# Altium footprint library custom-case.PcbLib: 380 footprints (part 9 of 24)
Each footprint in its own frame and in the unit in brackets; x right, y up, seen from the top. Pads: shape width x height; smd on the part's side, far side on the other; paste and mask are expansions set on the pad; w line width, h text height; cw(c..) or ccw(c..) is an arc to the next point about the centre after c.
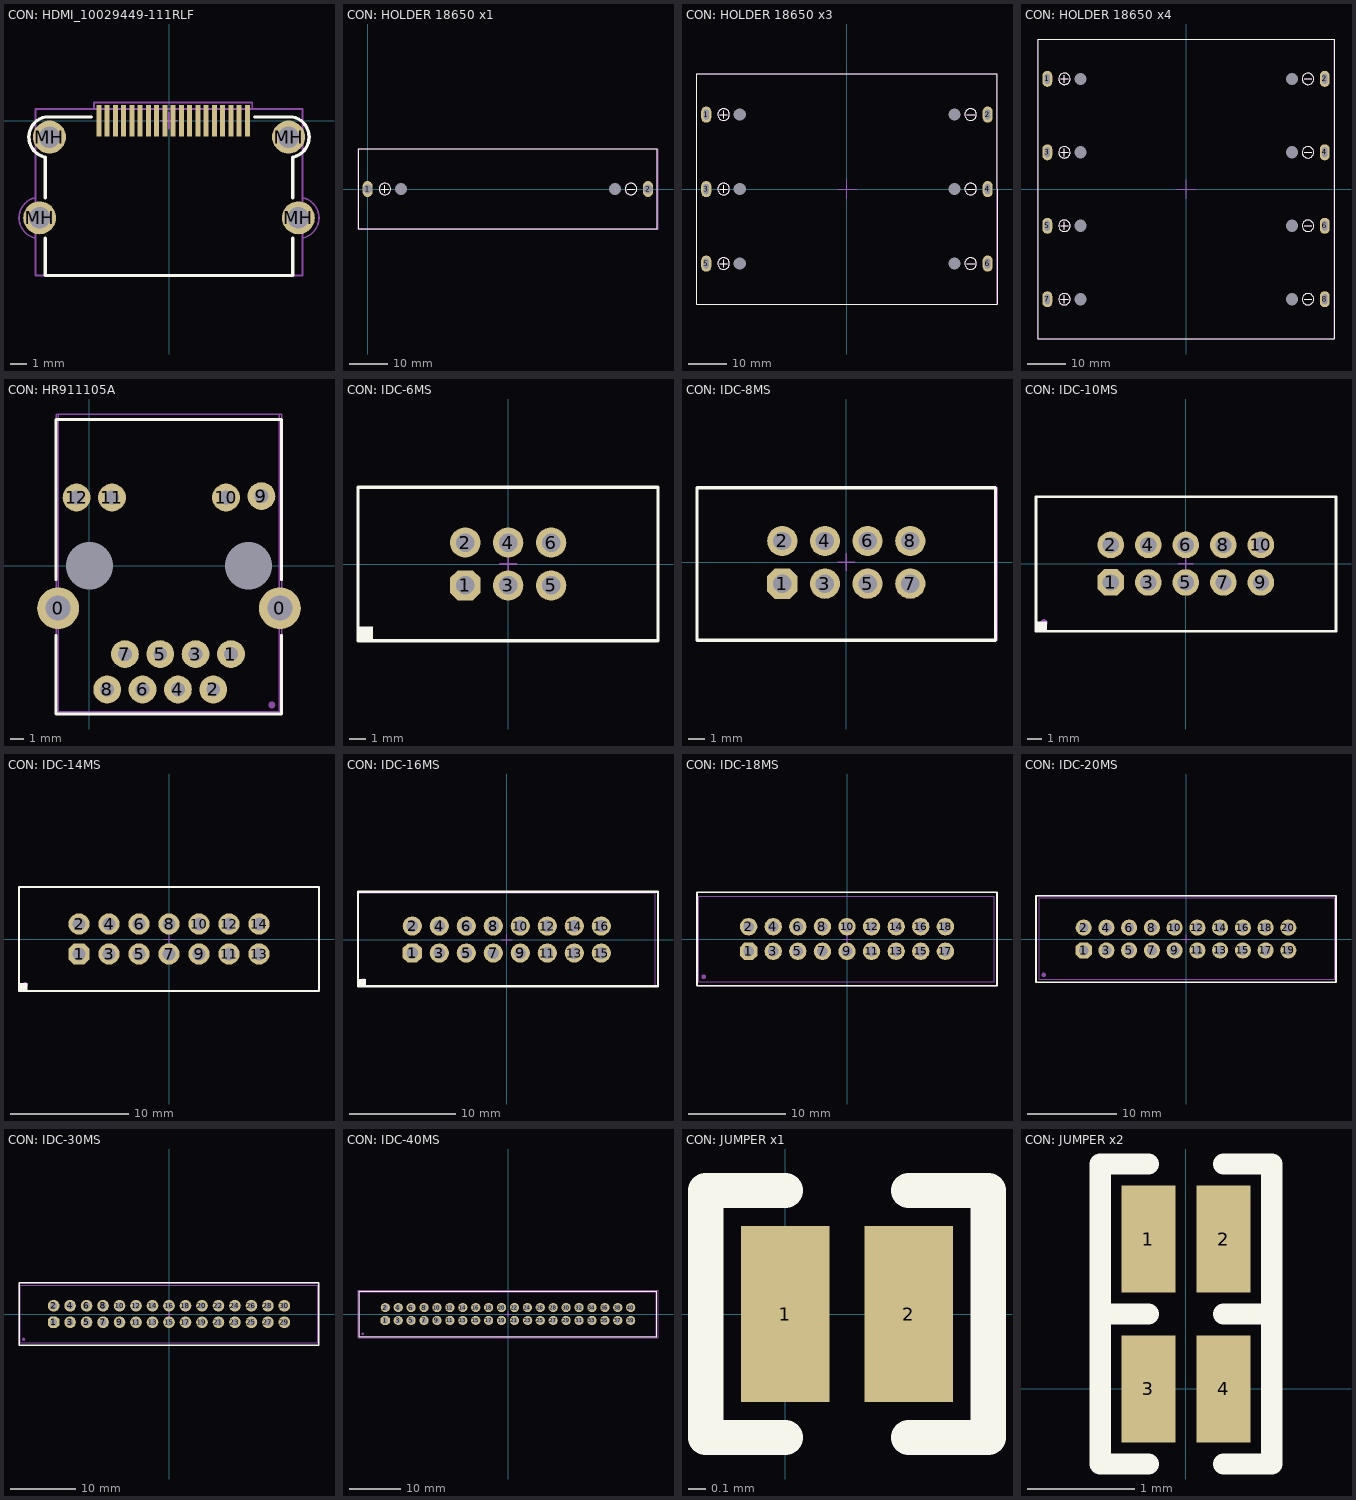
[diagram p8: the footprints below, top view; thin cyan lines are the x and y axes]

## CON: HDMI_10029449-111RLF [mm] "HDMI 1.4, Amphenol"
pads (23):
  rect 0.3x1.9 smd mask+0.102: 1(4.75,0) 2(4.25,0) 3(3.75,0) 4(3.25,0) 5(2.75,0) 6(2.25,0) 7(1.75,0) 8(1.25,0) 9(0.75,0) 10(0.25,0) 11(-0.25,0) 12(-0.75,0) 13(-1.25,0) 14(-1.75,0) 15(-2.25,0) 16(-2.75,0) 17(-3.25,0) 18(-3.75,0) 19(-4.25,0)
  round 2 hole 1.3 mask+0.102: MH(-7.85,-5.9) MH(-7.25,-1) MH(7.25,-1) MH(7.85,-5.9)
Top Overlay:
  lines w0.2: -7.505,-2.224 cw(c-7.25,-1) -7.505,0.224 -4.7,0.224 ; -7.5,-7.125 -7.5,-9.4 7.5,-9.4 7.5,-7.125 ; -7.5,-4.675 -7.5,-2.224 ; 5.2,0.224 7.505,0.224 cw(c7.25,-1) 7.505,-2.224 ; 7.5,-4.675 7.5,-2.224
Top Assy:
  lines w0.1: -8.1,-9.4 -8.1,0.7 8.1,0.7 8.1,-9.4 -8.1,-9.4
Size Area:
  lines w0.1: -8.1,-7.125 cw(c-7.85,-5.9) -8.1,-4.675 -8.1,-1.925 ; -8.1,-7.122 -8.1,-9.4 8.1,-9.4 8.1,-7.122 ; -8.1,-0.083 -8.1,0.7 -4.55,0.7 -4.55,1.1 5.05,1.1 5.05,0.7 8.1,0.7 8.1,-0.083 ; -8.097,-1.919 cw(c-7.25,-1) -8.097,-0.081 ; -0.5,0 0.5,0 ; 0,-0.5 0,0.5 ; 8.097,-1.919 ccw(c7.25,-1) 8.097,-0.081 ; 8.1,-7.125 ccw(c7.85,-5.9) 8.1,-4.675 8.1,-1.925
3D body "10029449-111RLF v1.step": height 6.28, standoff -1.86, extent -8.1,-9.4 8.1,0.7

## CON: HOLDER 18650 x1 [mm]
pads (4):
  oval 2.6x4.2 hole 2.4 square: 1(0,0) 2(72.9,0)
  round 0 hole 3.2: 2(8.7,0) 2(64.3,0)
Top Overlay:
  circle w0.2: c68.5,0 r1.5
  circle w0.2: c4.5,0 r1.5
  lines w0.2: 3.5,0 5.5,0 ; 4.5,-1 4.5,1 ; 67.5,0 69.5,0 ; -2.325,-10.4 75.325,-10.4 75.325,10.4 -2.325,10.4 -2.325,-10.4
Top Assy:
  lines w0.1: -2.325,-10.4 -2.325,10.4 75.325,10.4 75.325,-10.4 -2.325,-10.4
3D model:
  circle w0.1: c4.5,0 r1.5
  circle w0.1: c68.5,0 r1.5
  lines w0.1: 3.5,0 5.5,0 ; 4.5,-1 4.5,1 ; 67.5,0 69.5,0
Size Area:
  lines w0.1: -2.5,-10.5 75.5,-10.5 75.5,10.5 -2.5,10.5 -2.5,-10.5
3D body "User Library-18650 battery.STEP": height 21.87, standoff 3.67, extent 3.875,-9.05 69.025,9.15
3D body "User Library-18650 Full.STEP": height 21.65, standoff -3.83, extent -2.325,-10.4 75.325,10.4

## CON: HOLDER 18650 x3 [mm] "BK-18650-PC6, MPD"
pads (12):
  oval 2.6x4.2 hole 1.4 slot 2.6 at 90 deg: 1(-36.45,19.3) 2(36.45,19.3) 3(-36.45,0) 4(36.45,0) 5(-36.45,-19.3) 6(36.45,-19.3)
  round 0 hole 3.2: 2(-27.75,-19.3) 2(-27.75,0) 2(-27.75,19.3) 2(27.85,-19.3) 2(27.85,0) 2(27.85,19.3)
Top Overlay:
  circle w0.2: c-31.95,19.3 r1.5
  circle w0.2: c32.05,19.3 r1.5
  circle w0.2: c-31.95,-19.3 r1.5
  circle w0.2: c32.05,-19.3 r1.5
  circle w0.2: c-31.95,0 r1.5
  circle w0.2: c32.05,0 r1.5
  lines w0.2: -32.95,-19.3 -30.95,-19.3 ; -32.95,0 -30.95,0 ; -32.95,19.3 -30.95,19.3 ; -31.95,-20.3 -31.95,-18.3 ; -31.95,-1 -31.95,1 ; -31.95,18.3 -31.95,20.3 ; 31.05,-19.3 33.05,-19.3 ; 31.05,0 33.05,0 ; 31.05,19.3 33.05,19.3 ; -38.85,-29.85 38.875,-29.85 38.85,29.875 -38.85,29.85 -38.85,-29.85
Top Assy:
  circle w0.1: c32.05,-19.3 r1.5
  circle w0.1: c32.05,0 r1.5
  circle w0.1: c32.05,19.3 r1.5
  circle w0.1: c-31.95,19.3 r1.5
  circle w0.1: c-31.95,-19.3 r1.5
  circle w0.1: c-31.95,0 r1.5
  lines w0.1: -32.95,-19.3 -30.95,-19.3 ; -32.95,0 -30.95,0 ; -32.95,19.3 -30.95,19.3 ; -31.95,-20.3 -31.95,-18.3 ; -31.95,-1 -31.95,1 ; -31.95,18.3 -31.95,20.3 ; 31.05,-19.3 33.05,-19.3 ; 31.05,0 33.05,0 ; 31.05,19.3 33.05,19.3 ; -38.85,-29.85 38.85,-29.85 38.85,29.85 -38.85,29.85 -38.85,-29.85
Size Area:
  lines w0.1: -2.5,0 2.5,0 ; 0,-2.5 0,2.5 ; -38.85,-29.85 38.85,-29.85 38.85,29.85 -38.85,29.85 -38.85,-29.85
3D body "User Library-18650 battery.STEP": height 21.87, standoff 3.67, extent -32.575,10.25 32.575,28.45
3D body "User Library-18650 battery.STEP": height 21.87, standoff 3.67, extent -32.575,-9.05 32.575,9.15
3D body "User Library-18650 battery.STEP": height 21.87, standoff 3.67, extent -32.575,-28.35 32.575,-10.15
3D body "BK-18650-PC6.STEP": height 21.74, standoff -3, extent -38.85,-29.845 38.85,29.845

## CON: HOLDER 18650 x4 [mm] "BK-18650-PC8, MPD"
pads (16):
  oval 2.6x4.2 hole 1.4 slot 2.6 at 90 deg: 1(-36.45,28.95) 2(36.45,28.95) 3(-36.45,9.65) 4(36.45,9.65) 5(-36.45,-9.65) 6(36.45,-9.65) 7(-36.45,-28.95) 8(36.45,-28.95)
  round 0 hole 3.2: 2(-27.75,-28.95) 2(-27.75,-9.65) 2(-27.75,9.65) 2(-27.75,28.95) 2(27.85,-28.95) 2(27.85,-9.65) 2(27.85,9.65) 2(27.85,28.95)
Top Overlay:
  circle w0.2: c-31.95,28.95 r1.5
  circle w0.2: c32.05,28.95 r1.5
  circle w0.2: c-31.95,-9.65 r1.5
  circle w0.2: c32.05,-9.65 r1.5
  circle w0.2: c-31.95,9.65 r1.5
  circle w0.2: c32.05,9.65 r1.5
  circle w0.2: c-31.95,-28.95 r1.5
  circle w0.2: c32.05,-28.95 r1.5
  lines w0.2: -32.95,-28.95 -30.95,-28.95 ; -32.95,-9.65 -30.95,-9.65 ; -32.95,9.65 -30.95,9.65 ; -32.95,28.95 -30.95,28.95 ; -31.95,-29.95 -31.95,-27.95 ; -31.95,-10.65 -31.95,-8.65 ; -31.95,8.65 -31.95,10.65 ; -31.95,27.95 -31.95,29.95 ; 31.05,-28.95 33.05,-28.95 ; 31.05,-9.65 33.05,-9.65 ; 31.05,9.65 33.05,9.65 ; 31.05,28.95 33.05,28.95 ; -39.025,39.4 -39,-39.4 39,-39.375 38.975,39.4 -39.025,39.4
Top Assy:
  circle w0.1: c-31.95,28.95 r1.5
  circle w0.1: c-31.95,9.65 r1.5
  circle w0.1: c-31.95,-9.65 r1.5
  circle w0.1: c-31.95,-28.95 r1.5
  circle w0.1: c32.05,-9.65 r1.5
  circle w0.1: c32.05,9.65 r1.5
  circle w0.1: c32.05,28.95 r1.5
  circle w0.1: c32.05,-28.95 r1.5
  lines w0.1: -32.95,-28.95 -30.95,-28.95 ; -32.95,-9.65 -30.95,-9.65 ; -32.95,9.65 -30.95,9.65 ; -32.95,28.95 -30.95,28.95 ; -31.95,-29.95 -31.95,-27.95 ; -31.95,-10.65 -31.95,-8.65 ; -31.95,8.65 -31.95,10.65 ; -31.95,27.95 -31.95,29.95 ; 31.05,-28.95 33.05,-28.95 ; 31.05,-9.65 33.05,-9.65 ; 31.05,9.65 33.05,9.65 ; 31.05,28.95 33.05,28.95 ; -39,-39.4 -39,39.425 38.975,39.425 38.975,-39.4 -39,-39.4
Size Area:
  lines w0.1: -2.5,0 2.5,0 ; 0,-2.5 0,2.5 ; -39,-39.4 38.975,-39.4 38.975,39.425 -39,39.425 -39,-39.4
3D body "User Library-18650 battery.STEP": height 21.87, standoff 3.67, extent -32.575,19.9 32.575,38.1
3D body "User Library-18650 battery.STEP": height 21.87, standoff 3.67, extent -32.575,0.6 32.575,18.8
3D body "User Library-18650 battery.STEP": height 21.87, standoff 3.67, extent -32.575,-18.7 32.575,-0.5
3D body "User Library-18650 battery.STEP": height 21.87, standoff 3.67, extent -32.575,-38 32.575,-19.8
3D body "BK-18650-PC8.STEP": height 21.74, standoff -3, extent -38.99,-39.388 38.99,39.452

## CON: HR911105A [mm]
height 14
pads (17):
  round 3 hole 1.8: 0(-2.25,-3.05) 0(13.68,-3.05)
  oval 0.7x0 hole 3.4: 0(0,0) 0(11.43,0)
  round 2 hole 1: 1(10.165,-6.35) 2(8.895,-8.89) 3(7.625,-6.35) 4(6.355,-8.89) 5(5.085,-6.35) 6(3.815,-8.89) 7(2.545,-6.35) 8(1.275,-8.89) 9(12.35,5) 10(9.81,4.9) 11(1.62,4.9) 12(-0.92,4.9)
  round 0.5 on Mech1: ""(13.1,-10)
Top Overlay:
  lines w0.2: -2.4,-5 -2.4,-10.65 13.8,-10.65 13.8,-5 ; -2.4,-1 -2.4,10.5 13.8,10.5 13.8,-1
Top Assy:
  lines w0.1: -2.24,-10.5 -2.24,10.9 13.64,10.9 13.64,-10.5 -2.24,-10.5
Size Area:
  lines w0.1: -2.4,-10.6 -2.4,-1 -2.4,10.9 13.8,10.9 13.8,-10.6 -2.4,-10.6
3D body "User Library-HR911105A.STEP": height 13.6, standoff -2.9, extent -2.24,-10.5 13.64,10.9

## CON: IDC-6MS [mm] "IDC-6MS 6 pin PCB-mount connector"
height 10
pads (7):
  oct 1.8x1.8 hole 1.1: 1(-2.54,-1.27)
  round 1.8 hole 1.1: 2(-2.54,1.27) 3(0,-1.27) 4(0,1.27) 5(2.54,-1.27) 6(2.54,1.27)
  round 0.5 on Mech1: ""(-8.4,-4)
Top Overlay:
  rectangle: -8.89,-4.55 -8,-3.7
  lines w0.2: -8.89,-4.55 8.87,-4.55 8.87,4.55 -8.89,4.55 -8.89,-4.55
Top Assy:
  lines w0.1: -8.89,-4.55 -8.89,4.55 8.87,4.55 8.87,-4.55 -8.89,-4.55
Size Area:
  lines w0.1: -0.5,0 0.5,0 ; 0,-0.5 0,0.5 ; -8.89,-4.55 8.87,-4.55 8.87,4.55 -8.89,4.55 -8.89,-4.55
3D body "IDC-6MS.STEP": height 9, standoff -3, extent -8.89,-4.55 8.87,4.55

## CON: IDC-8MS [mm]
height 10
pads (8):
  oct 1.8x1.8 hole 1.1: 1(-3.81,-1.27)
  round 1.8 hole 1.1: 2(-3.81,1.27) 3(-1.27,-1.27) 4(-1.27,1.27) 5(1.27,-1.27) 6(1.27,1.27) 7(3.81,-1.27) 8(3.81,1.27)
Top Overlay:
  lines w0.2: -8.89,-4.65 8.89,-4.65 8.89,4.45 -8.89,4.45 -8.89,-4.65
Top Assy:
  lines w0.1: -8.89,-4.65 8.89,-4.65 8.89,4.45 -8.89,4.45 -8.89,-4.65
Size Area:
  lines w0.1: -0.5,0 0.5,0 ; 0,-0.5 0,0.5 ; -8.89,-4.65 8.975,-4.65 8.975,4.45 -8.89,4.45 -8.89,-4.65
3D body "6666.STEP": height 8.9, standoff -3.2, extent -8.89,-4.65 8.89,4.45

## CON: IDC-10MS [mm] "IDC-10MS 10 pin PCB-mount header"
height 10
pads (11):
  oct 1.8x1.8 hole 1.1: 1(-5.08,-1.27)
  round 1.8 hole 1.1: 2(-5.08,1.27) 3(-2.54,-1.27) 4(-2.54,1.27) 5(0,-1.27) 6(0,1.27) 7(2.54,-1.27) 8(2.54,1.27) 9(5.08,-1.27) 10(5.08,1.27)
  round 0.5 on Mech1: ""(-9.6,-4)
Top Overlay:
  rectangle: -10.14,-4.572 -9.4,-3.9
  lines w0.2: -10.14,-4.572 -10.14,4.528 10.16,4.528 10.16,-4.572 -10.14,-4.572
Top Assy:
  lines w0.1: -10.14,-4.572 10.16,-4.572 10.16,4.528 -10.14,4.528 -10.14,-4.572
Size Area:
  lines w0.1: -0.5,0 0.5,0 ; 0,-0.5 0,0.5 ; -10.14,-4.572 -10.14,4.528 10.16,4.528 10.16,-4.572 -10.14,-4.572
3D body "IDC-10MS.STEP": height 9, standoff -3.1, extent -10.14,-4.572 10.16,4.528

## CON: IDC-14MS [mm] "IDC-14MS connector"
height 9
pads (15):
  oct 1.8x1.8 hole 1.1: 1(-7.62,-1.27)
  round 1.8 hole 1.1: 2(-7.62,1.27) 3(-5.08,-1.27) 4(-5.08,1.27) 5(-2.54,-1.27) 6(-2.54,1.27) 7(0,-1.27) 8(0,1.27) 9(2.54,-1.27) 10(2.54,1.27) 11(5.08,-1.27) 12(5.08,1.27) 13(7.62,-1.27) 14(7.62,1.27)
  round 0.5 on Mech1: ""(-12.2,-3.9)
Top Overlay:
  rectangle: -12.7,-4.4 -11.96,-3.728
  lines w0.2: -12.7,-4.4 12.7,-4.4 12.7,4.4 -12.7,4.4 -12.7,-4.4
Top Assy:
  lines w0.1: -12.7,-4.4 -12.7,4.4 12.7,4.4 12.7,-4.4 -12.7,-4.4
Size Area:
  lines w0.1: -0.5,0 0.5,0 ; 0,-0.5 0,0.5 ; -12.7,-4.4 12.7,-4.4 12.7,4.4 -12.7,4.4 -12.7,-4.4
3D body "IDC-14MS.STEP": height 9.1, standoff -3, extent -12.715,-4.4 12.715,4.4

## CON: IDC-16MS [mm] "IDC-16MS straight leads pcb mount"
height 9
pads (17):
  oct 1.8x1.8 hole 1.1: 1(-8.89,-1.27)
  round 1.8 hole 1.1: 2(-8.89,1.27) 3(-6.35,-1.27) 4(-6.35,1.27) 5(-3.81,-1.27) 6(-3.81,1.27) 7(-1.27,-1.27) 8(-1.27,1.27) 9(1.27,-1.27) 10(1.27,1.27) 11(3.81,-1.27) 12(3.81,1.27) 13(6.35,-1.27) 14(6.35,1.27) 15(8.89,-1.27) 16(8.89,1.27)
  round 0.5 on Mech1: ""(-13.5,-3.9)
Top Overlay:
  rectangle: -14,-4.4 -13.26,-3.728
  lines w0.2: -14,-4.4 14.224,-4.4 14.224,4.5 -14,4.5 -14,-4.4
Top Assy:
  lines w0.1: -13.985,-4.4 -13.985,4.285 -13.985,4.4 13.985,4.4 13.985,-4.4 -13.985,-4.4
Size Area:
  lines w0.1: -0.5,0 0.5,0 ; 0,-0.5 0,0.5 ; -14,-4.4 14.224,-4.4 14.224,4.5 -14,4.5 -14,-4.4
3D body "IDC-16MS.STEP": height 9.1, standoff -3, extent -13.985,-4.4 13.985,4.4

## CON: IDC-18MS [mm]
height 10
pads (19):
  oct 1.8x1.8 hole 1.1: 1(-10.16,-1.27)
  round 1.8 hole 1.1: 2(-10.16,1.27) 3(-7.62,-1.27) 4(-7.62,1.27) 5(-5.08,-1.27) 6(-5.08,1.27) 7(-2.54,-1.27) 8(-2.54,1.27) 9(0,-1.27) 10(0,1.27) 11(2.54,-1.27) 12(2.54,1.27) 13(5.08,-1.27) 14(5.08,1.27) 15(7.62,-1.27) 16(7.62,1.27) 17(10.16,-1.27) 18(10.16,1.27)
  round 0.5 on Mech1: 40(-14.8,-3.9)
Top Overlay:
  lines w0.2: -15.494,-4.826 -15.494,4.826 15.494,4.826 15.494,-4.826 -15.494,-4.826
Top Assy:
  lines w0.1: -15.3,-4.4 15.2,-4.4 15.2,4.4 -15.3,4.4 -15.3,-4.4
Size Area:
  lines w0.1: -0.5,0 0.5,0 ; 0,-0.5 0,0.5 ; -15.494,-4.826 -15.494,4.826 15.494,4.826 15.494,-4.826 -15.494,-4.826
3D body "IDC-18MS.STEP": height 10.54, standoff -1, extent -15.28,-4.378 15.23,4.422

## CON: IDC-20MS [mm]
height 10
pads (21):
  oct 1.8x1.8 hole 1.1: 1(-11.43,-1.27)
  round 1.8 hole 1.1: 2(-11.43,1.27) 3(-8.89,-1.27) 4(-8.89,1.27) 5(-6.35,-1.27) 6(-6.35,1.27) 7(-3.81,-1.27) 8(-3.81,1.27) 9(-1.27,-1.27) 10(-1.27,1.27) 11(1.27,-1.27) 12(1.27,1.27) 13(3.81,-1.27) 14(3.81,1.27) 15(6.35,-1.27) 16(6.35,1.27) 17(8.89,-1.27) 18(8.89,1.27) 19(11.43,-1.27) 20(11.43,1.27)
  round 0.5 on Mech1: 41(-15.9,-4)
Top Overlay:
  lines w0.2: -16.764,-4.826 -16.764,4.826 16.764,4.826 16.764,-4.826 -16.764,-4.826
Top Assy:
  lines w0.1: -16.4,-4.5 16.6,-4.5 16.6,4.6 -16.4,4.6 -16.4,-4.5
Size Area:
  lines w0.1: -0.5,0 0.5,0 ; 0,-0.5 0,0.5 ; -16.764,-4.826 -16.764,4.826 16.764,4.826 16.764,-4.826 -16.764,-4.826
3D body "IDC-20MS.STEP": height 9, standoff -3, extent -16.43,-4.52 16.57,4.58

## CON: IDC-30MS [mm]
height 10
pads (31):
  oct 1.8x1.8 hole 1.1: 1(-17.78,-1.27)
  round 1.8 hole 1.1: 2(-17.78,1.27) 3(-15.24,-1.27) 4(-15.24,1.27) 5(-12.7,-1.27) 6(-12.7,1.27) 7(-10.16,-1.27) 8(-10.16,1.27) 9(-7.62,-1.27) 10(-7.62,1.27) 11(-5.08,-1.27) 12(-5.08,1.27) 13(-2.54,-1.27) 14(-2.54,1.27) 15(0,-1.27) 16(0,1.27) 17(2.54,-1.27) 18(2.54,1.27) 19(5.08,-1.27) 20(5.08,1.27) 21(7.62,-1.27) 22(7.62,1.27) 23(10.16,-1.27) 24(10.16,1.27) 25(12.7,-1.27) 26(12.7,1.27) 27(15.24,-1.27) 28(15.24,1.27) 29(17.78,-1.27) 30(17.78,1.27)
  round 0.5 on Mech1: 42(-22.4,-3.9)
Top Overlay:
  lines w0.2: -23.114,-4.826 -23.114,4.826 23.114,4.826 23.114,-4.826 -23.114,-4.826
Top Assy:
  lines w0.1: -22.9,-4.4 22.9,-4.4 22.9,4.4 -22.9,4.4 -22.9,-4.4
Size Area:
  lines w0.1: -0.5,0 0.5,0 ; 0,-0.5 0,0.5 ; -23.114,-4.826 -23.114,4.826 23.114,4.826 23.114,-4.826 -23.114,-4.826
3D body "IDC-30MS.STEP": height 8.78, standoff -3, extent -22.881,-4.392 22.869,4.408

## CON: IDC-40MS [mm]
height 10
pads (41):
  oct 1.8x1.8 hole 1.1: 1(-24.13,-1.27)
  round 1.8 hole 1.1: 2(-24.13,1.27) 3(-21.59,-1.27) 4(-21.59,1.27) 5(-19.05,-1.27) 6(-19.05,1.27) 7(-16.51,-1.27) 8(-16.51,1.27) 9(-13.97,-1.27) 10(-13.97,1.27) 11(-11.43,-1.27) 12(-11.43,1.27) 13(-8.89,-1.27) 14(-8.89,1.27) 15(-6.35,-1.27) 16(-6.35,1.27) 17(-3.81,-1.27) 18(-3.81,1.27) 19(-1.27,-1.27) 20(-1.27,1.27) 21(1.27,-1.27) 22(1.27,1.27) 23(3.87,-1.27) 24(3.81,1.27) 25(6.35,-1.27) 26(6.35,1.27) 27(8.89,-1.27) 28(8.89,1.27) 29(11.43,-1.27) 30(11.43,1.27) 31(13.97,-1.27) 32(13.97,1.27) 33(16.51,-1.27) 34(16.51,1.27) 35(19.05,-1.27) 36(19.05,1.27) 37(21.59,-1.27) 38(21.59,1.27) 39(24.13,-1.27) 40(24.13,1.27)
  round 0.5 on Mech1: 43(-28.6,-3.9)
Top Overlay:
  lines w0.2: -29.3,-4.5 29.3,-4.5 29.3,4.5 -29.3,4.5 -29.3,-4.5
Top Assy:
  lines w0.1: -29.2,-4.4 -29.2,4.4 29.2,4.4 29.2,-4.4 -29.2,-4.4
Size Area:
  lines w0.1: -0.5,0 0.5,0 ; 0,-0.5 0,0.5 ; -29.5,-4.7 29.5,-4.7 29.5,4.7 -29.5,4.7 -29.5,-4.7
3D body "IDC-40MS.STEP": height 8.78, standoff -3, extent -29.225,-4.4 29.225,4.4

## CON: JUMPER x1 [mm]
pads (2):
  rect 0.5x1 smd: 1(0,0) 2(0.7,0)
Top Overlay:
  lines w0.2: 0,-0.7 -0.45,-0.7 -0.45,0.7 0,0.7 ; 0.7,-0.7 1.15,-0.7 1.15,0.7 0.7,0.7

## CON: JUMPER x2 [mm]
pads (4):
  rect 0.5x1 smd: 1(-0.35,1.4) 2(0.35,1.4) 3(-0.35,0) 4(0.35,0)
Top Overlay:
  lines w0.2: -0.35,-0.7 -0.8,-0.7 -0.8,0.7 ; -0.35,2.1 -0.8,2.1 -0.8,0.7 ; 0.35,-0.7 0.8,-0.7 0.8,0.7 ; 0.35,2.1 0.8,2.1 0.8,0.7 ; -0.8,0.7 -0.35,0.7 -0.8,0.7 ; 0.8,0.7 0.35,0.7 0.8,0.7